# Altium footprint library SMD_Bauteile.PcbLib: 355 footprints (part 8 of 23)
Each footprint in its own frame and in the unit in brackets; x right, y up, seen from the top. Pads: shape width x height; smd on the part's side, far side on the other; paste and mask are expansions set on the pad; w line width, h text height; cw(c..) or ccw(c..) is an arc to the next point about the centre after c.
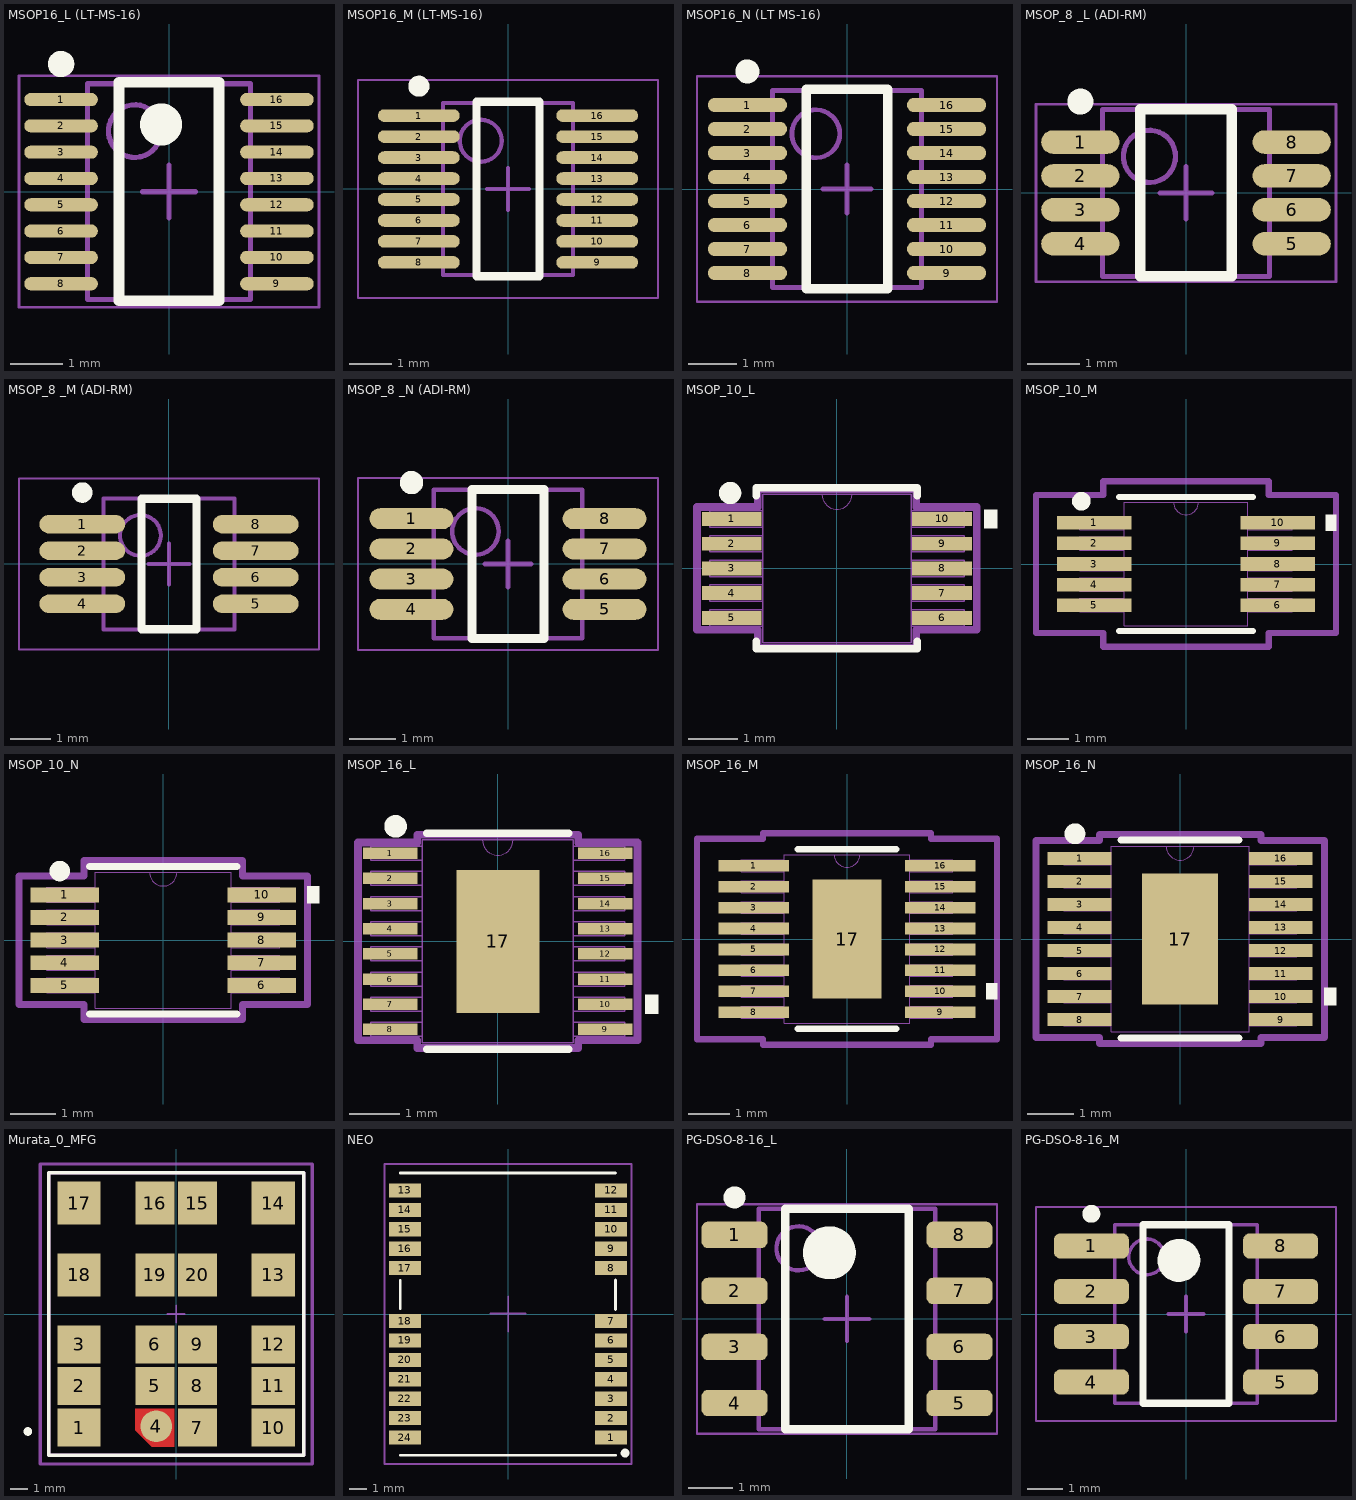
[diagram p7: the footprints below, top view; thin cyan lines are the x and y axes]

## MSOP16_L (LT-MS-16) [mm] "SOP, 16-Leads, Body 4.04x3.00mm, Pitch 0.50mm, IPC High Density"
height 1.1
pads (16):
  oval 1.4x0.25 smd: 1(-2.05,1.75) 2(-2.05,1.25) 3(-2.05,0.75) 4(-2.05,0.25) 5(-2.05,-0.25) 6(-2.05,-0.75) 7(-2.05,-1.25) 8(-2.05,-1.75) 9(2.05,-1.75) 10(2.05,-1.25) 11(2.05,-0.75) 12(2.05,-0.25) 13(2.05,0.25) 14(2.05,0.75) 15(2.05,1.25) 16(2.05,1.75)
Top Overlay:
  circle w0.25: c-2.05,2.425 r0.125
  circle w0.4: c-0.15,1.275 r0.2
  lines w0.2: -0.95,-2.075 -0.95,2.075 0.95,2.075 0.95,-2.075 -0.95,-2.075
Mech Misc 1:
  circle w0.1: c-0.65,1.15 r0.5
  lines w0.1: -1.55,-2.05 -1.55,2.05 1.55,2.05 1.55,-2.05 -1.55,-2.05
Mech 15:
  lines w0.05: -2.85,-2.2 -2.85,2.2 2.85,2.2 2.85,-2.2 -2.85,-2.2
  lines w0.1: -0.5,0 0.5,0 ; 0,-0.5 0,0.5
3D body: height 1.1, standoff 0.05, extent -1.55,-2.05 1.55,2.05

## MSOP16_M (LT-MS-16) [mm] "SOP, 16-Leads, Body 4.04x3.00mm, Pitch 0.50mm, IPC Low Density"
height 1.1
pads (16):
  oval 1.95x0.3 smd: 1(-2.125,1.75) 2(-2.125,1.25) 3(-2.125,0.75) 4(-2.125,0.25) 5(-2.125,-0.25) 6(-2.125,-0.75) 7(-2.125,-1.25) 8(-2.125,-1.75) 9(2.125,-1.75) 10(2.125,-1.25) 11(2.125,-0.75) 12(2.125,-0.25) 13(2.125,0.25) 14(2.125,0.75) 15(2.125,1.25) 16(2.125,1.75)
Top Overlay:
  circle w0.25: c-2.125,2.45 r0.125
  lines w0.2: -0.75,-2.075 -0.75,2.075 0.75,2.075 0.75,-2.075 -0.75,-2.075
Mech Misc 1:
  circle w0.1: c-0.65,1.15 r0.5
  lines w0.1: -1.55,-2.05 -1.55,2.05 1.55,2.05 1.55,-2.05 -1.55,-2.05
Mech 15:
  lines w0.05: -3.575,-2.6 -3.575,2.6 3.575,2.6 3.575,-2.6 -3.575,-2.6
  lines w0.1: -0.5,0 0.5,0 ; 0,-0.5 0,0.5
3D body: height 1.1, standoff 0.05, extent -1.55,-2.05 1.55,2.05

## MSOP16_N (LT MS-16) [mm] "SOP, 16-Leads, Body 4.04x3.00mm, Pitch 0.50mm, IPC Medium Density"
height 1.1
pads (16):
  oval 1.65x0.3 smd: 1(-2.075,1.75) 2(-2.075,1.25) 3(-2.075,0.75) 4(-2.075,0.25) 5(-2.075,-0.25) 6(-2.075,-0.75) 7(-2.075,-1.25) 8(-2.075,-1.75) 9(2.075,-1.75) 10(2.075,-1.25) 11(2.075,-0.75) 12(2.075,-0.25) 13(2.075,0.25) 14(2.075,0.75) 15(2.075,1.25) 16(2.075,1.75)
Top Overlay:
  circle w0.25: c-2.075,2.45 r0.125
  lines w0.2: -0.85,-2.075 -0.85,2.075 0.85,2.075 0.85,-2.075 -0.85,-2.075
Mech Misc 1:
  circle w0.1: c-0.65,1.15 r0.5
  lines w0.1: -1.55,-2.05 -1.55,2.05 1.55,2.05 1.55,-2.05 -1.55,-2.05
Mech 15:
  lines w0.05: -3.125,-2.35 -3.125,2.35 3.125,2.35 3.125,-2.35 -3.125,-2.35
  lines w0.1: -0.5,0 0.5,0 ; 0,-0.5 0,0.5
3D body: height 1.1, standoff 0.05, extent -1.55,-2.05 1.55,2.05

## MSOP_8 _L (ADI-RM) [mm] "SOP, 8-Leads, Body 3x3mm, Pitch 0.65mm, IPC High Density"
height 1.1
pads (8):
  oval 1.5x0.45 smd: 1(-2.025,0.975) 2(-2.025,0.325) 3(-2.025,-0.325) 4(-2.025,-0.975) 5(2.025,-0.975) 6(2.025,-0.325) 7(2.025,0.325) 8(2.025,0.975)
Top Overlay:
  circle w0.25: c-2.025,1.75 r0.125
  lines w0.2: -0.875,-1.6 -0.875,1.6 0.875,1.6 0.875,-1.6 -0.875,-1.6
Mech Misc 1:
  circle w0.1: c-0.7,0.7 r0.5
  lines w0.1: -1.6,-1.6 -1.6,1.6 1.6,1.6 1.6,-1.6 -1.6,-1.6
Mech 15:
  lines w0.05: -2.875,-1.7 -2.875,1.7 2.875,1.7 2.875,-1.7 -2.875,-1.7
  lines w0.1: -0.5,0 0.5,0 ; 0,-0.5 0,0.5
3D body: height 1.1, standoff 0, extent -1.6,-1.6 1.6,1.6

## MSOP_8 _M (ADI-RM) [mm] "SOP, 8-Leads, Body 3x3mm, Pitch 0.65mm, IPC Low Density"
height 1.1
pads (8):
  oval 2.1x0.45 smd: 1(-2.125,0.975) 2(-2.125,0.325) 3(-2.125,-0.325) 4(-2.125,-0.975) 5(2.125,-0.975) 6(2.125,-0.325) 7(2.125,0.325) 8(2.125,0.975)
Top Overlay:
  circle w0.25: c-2.125,1.75 r0.125
  lines w0.2: -0.675,-1.6 -0.675,1.6 0.675,1.6 0.675,-1.6 -0.675,-1.6
Mech Misc 1:
  circle w0.1: c-0.7,0.7 r0.5
  lines w0.1: -1.6,-1.6 -1.6,1.6 1.6,1.6 1.6,-1.6 -1.6,-1.6
Mech 15:
  lines w0.05: -3.675,-2.1 -3.675,2.1 3.675,2.1 3.675,-2.1 -3.675,-2.1
  lines w0.1: -0.5,0 0.5,0 ; 0,-0.5 0,0.5
3D body: height 1.1, standoff 0, extent -1.6,-1.6 1.6,1.6

## MSOP_8 _N (ADI-RM) [mm] "SOP, 8-Leads, Body 3x3mm, Pitch 0.65mm, IPC Medium Density"
height 1.1
pads (8):
  oval 1.8x0.45 smd: 1(-2.075,0.975) 2(-2.075,0.325) 3(-2.075,-0.325) 4(-2.075,-0.975) 5(2.075,-0.975) 6(2.075,-0.325) 7(2.075,0.325) 8(2.075,0.975)
Top Overlay:
  circle w0.25: c-2.075,1.75 r0.125
  lines w0.2: -0.775,-1.6 -0.775,1.6 0.775,1.6 0.775,-1.6 -0.775,-1.6
Mech Misc 1:
  circle w0.1: c-0.7,0.7 r0.5
  lines w0.1: -1.6,-1.6 -1.6,1.6 1.6,1.6 1.6,-1.6 -1.6,-1.6
Mech 15:
  lines w0.05: -3.225,-1.85 -3.225,1.85 3.225,1.85 3.225,-1.85 -3.225,-1.85
  lines w0.1: -0.5,0 0.5,0 ; 0,-0.5 0,0.5
3D body: height 1.1, standoff 0, extent -1.6,-1.6 1.6,1.6

## MSOP_10_L [mm] "10-Lead Plastic MSOP"
pads (10):
  rect 1.206x0.279 smd paste+0 mask+0: 1(-2.124,1) 2(-2.124,0.5) 3(-2.124,0) 4(-2.124,-0.5) 5(-2.124,-1) 6(2.124,-1) 7(2.124,-0.5) 8(2.124,0) 9(2.124,0.5) 10(2.124,1)
Top Overlay:
  circle w0.25: c-2.159,1.524 r0.1
  region: 2.981,1.191 3.235,1.191 3.235,0.81 2.981,0.81
  lines w0.152: -1.627,-1.472 -1.627,-1.627 1.627,-1.627 1.627,-1.472 ; -1.627,1.472 -1.627,1.627 1.627,1.627 1.627,1.472
Mech Misc 1:
  lines w0: -0.305,1.5 ccw(c0,1.5) 0.305,1.5
  lines w0.025: -2.575,-1.165 -1.5,-1.165 -1.5,-0.835 -2.575,-0.835 -2.575,-1.165 ; -2.575,-0.665 -1.5,-0.665 -1.5,-0.335 -2.575,-0.335 -2.575,-0.665 ; -2.575,-0.165 -1.5,-0.165 -1.5,0.165 -2.575,0.165 -2.575,-0.165 ; -2.575,0.335 -1.5,0.335 -1.5,0.665 -2.575,0.665 -2.575,0.335 ; -2.575,0.835 -1.5,0.835 -1.5,1.165 -2.575,1.165 -2.575,0.835 ; -1.5,-1.5 -1.5,1.5 1.5,1.5 1.5,-1.5 -1.5,-1.5 ; 1.5,-1.165 2.575,-1.165 2.575,-0.835 1.5,-0.835 1.5,-1.165 ; 1.5,-0.665 2.575,-0.665 2.575,-0.335 1.5,-0.335 1.5,-0.665 ; 1.5,-0.165 2.575,-0.165 2.575,0.165 1.5,0.165 1.5,-0.165 ; 1.5,0.335 2.575,0.335 2.575,0.665 1.5,0.665 1.5,0.335 ; 1.5,0.835 2.575,0.835 2.575,1.165 1.5,1.165 1.5,0.835
Mech 15:
  lines w0.152: -2.829,-1.241 -1.602,-1.241 -1.602,-1.602 1.602,-1.602 1.602,-1.241 2.829,-1.241 2.829,1.241 1.602,1.241 1.602,1.602 -1.602,1.602 -1.602,1.241 -2.829,1.241 -2.829,-1.241
3D body: height 0.25, standoff 0, extent 0,0 0.254,0.254
3D body "RM_10_ADI-L.step": height 1.1, standoff 0, extent -2.575,-1.5 2.575,1.5

## MSOP_10_M [mm] "10-Lead Plastic MSOP"
pads (10):
  rect 1.816x0.33 smd paste+0 mask+0: 1(-2.226,1) 2(-2.226,0.5) 3(-2.226,0) 4(-2.226,-0.5) 5(-2.226,-1) 6(2.226,-1) 7(2.226,-0.5) 8(2.226,0) 9(2.226,0.5) 10(2.226,1)
Top Overlay:
  circle w0.25: c-2.54,1.524 r0.1
  region: 3.388,1.191 3.642,1.191 3.642,0.81 3.388,0.81
  lines w0.152: -1.627,-1.627 1.627,-1.627 ; -1.627,1.627 1.627,1.627
Mech Misc 1:
  lines w0: -0.305,1.5 ccw(c0,1.5) 0.305,1.5
  lines w0.025: -2.575,-1.165 -2.575,-0.835 -1.5,-0.835 -1.5,-1.165 -2.575,-1.165 ; -2.575,-0.665 -2.575,-0.335 -1.5,-0.335 -1.5,-0.665 -2.575,-0.665 ; -2.575,-0.165 -2.575,0.165 -1.5,0.165 -1.5,-0.165 -2.575,-0.165 ; -2.575,0.335 -2.575,0.665 -1.5,0.665 -1.5,0.335 -2.575,0.335 ; -2.575,0.835 -2.575,1.165 -1.5,1.165 -1.5,0.835 -2.575,0.835 ; -1.5,-1.5 1.5,-1.5 1.5,1.5 -1.5,1.5 -1.5,-1.5 ; 1.5,-1.165 1.5,-0.835 2.575,-0.835 2.575,-1.165 1.5,-1.165 ; 1.5,-0.665 1.5,-0.335 2.575,-0.335 2.575,-0.665 1.5,-0.665 ; 1.5,-0.165 1.5,0.165 2.575,0.165 2.575,-0.165 1.5,-0.165 ; 1.5,0.335 1.5,0.665 2.575,0.665 2.575,0.335 1.5,0.335 ; 1.5,0.835 1.5,1.165 2.575,1.165 2.575,0.835 1.5,0.835
Mech 15:
  lines w0.152: -3.642,-1.673 -3.642,1.673 -2.008,1.673 -2.008,2.008 2.008,2.008 2.008,1.673 3.642,1.673 3.642,-1.673 2.008,-1.673 2.008,-2.008 -2.008,-2.008 -2.008,-1.673 -3.642,-1.673
3D body: height 0.25, standoff 0, extent 0,0 0.254,0.254
3D body "RM_10_ADI-M.step": height 1.1, standoff 0, extent -2.575,-1.5 2.575,1.5

## MSOP_10_N [mm] "10-Lead Plastic MSOP"
pads (10):
  rect 1.511x0.33 smd paste+0 mask+0: 1(-2.175,1) 2(-2.175,0.5) 3(-2.175,0) 4(-2.175,-0.5) 5(-2.175,-1) 6(2.175,-1) 7(2.175,-0.5) 8(2.175,0) 9(2.175,0.5) 10(2.175,1)
Top Overlay:
  circle w0.25: c-2.286,1.524 r0.1
  region: 3.185,1.191 3.439,1.191 3.439,0.81 3.185,0.81
  lines w0.152: -1.627,-1.627 1.627,-1.627 ; -1.627,1.627 1.627,1.627
Mech Misc 1:
  lines w0: -0.305,1.5 ccw(c0,1.5) 0.305,1.5
  lines w0.025: -2.575,-1.165 -1.5,-1.165 -1.5,-0.835 -2.575,-0.835 -2.575,-1.165 ; -2.575,-0.665 -1.5,-0.665 -1.5,-0.335 -2.575,-0.335 -2.575,-0.665 ; -2.575,-0.165 -1.5,-0.165 -1.5,0.165 -2.575,0.165 -2.575,-0.165 ; -2.575,0.335 -1.5,0.335 -1.5,0.665 -2.575,0.665 -2.575,0.335 ; -2.575,0.835 -1.5,0.835 -1.5,1.165 -2.575,1.165 -2.575,0.835 ; -1.5,-1.5 -1.5,1.5 1.5,1.5 1.5,-1.5 -1.5,-1.5 ; 1.5,-1.165 2.575,-1.165 2.575,-0.835 1.5,-0.835 1.5,-1.165 ; 1.5,-0.665 2.575,-0.665 2.575,-0.335 1.5,-0.335 1.5,-0.665 ; 1.5,-0.165 2.575,-0.165 2.575,0.165 1.5,0.165 1.5,-0.165 ; 1.5,0.335 2.575,0.335 2.575,0.665 1.5,0.665 1.5,0.335 ; 1.5,0.835 2.575,0.835 2.575,1.165 1.5,1.165 1.5,0.835
Mech 15:
  lines w0.152: -3.185,-1.419 -1.754,-1.419 -1.754,-1.754 1.754,-1.754 1.754,-1.419 3.185,-1.419 3.185,1.419 1.754,1.419 1.754,1.754 -1.754,1.754 -1.754,1.419 -3.185,1.419 -3.185,-1.419
3D body: height 0.25, standoff 0, extent 0,0 0.254,0.254
3D body "RM_10_ADI.step": height 1.1, standoff 0, extent -2.575,-1.5 2.575,1.5

## MSOP_16_L [mm] "16-Lead Plastic MSOP"
pads (17):
  rect 1.086x0.229 smd paste+0 mask+0: 1(-2.134,1.75) 2(-2.134,1.25) 3(-2.134,0.75) 4(-2.134,0.25) 5(-2.134,-0.25) 6(-2.134,-0.75) 7(-2.134,-1.25) 8(-2.134,-1.75) 9(2.134,-1.75) 10(2.134,-1.25) 11(2.134,-0.75) 12(2.134,-0.25) 13(2.134,0.25) 14(2.134,0.75) 15(2.134,1.25) 16(2.134,1.75)
  rect 1.651x2.845 smd paste-1.41 mask+0: 17(0,0)
Top Overlay:
  circle w0.25: c-2.032,2.286 r0.1
  region: 2.931,-1.06 3.185,-1.06 3.185,-1.441 2.931,-1.441
  lines w0.152: -1.414,-2.146 1.414,-2.146 ; -1.414,2.146 1.414,2.146
Top Paste:
  region: 0.726,1.322 -0.726,1.322 -0.726,0.1 0.726,0.1
  region: 0.726,-0.1 -0.726,-0.1 -0.726,-1.322 0.726,-1.322
Mech Misc 1:
  lines w0: -0.305,2.019 ccw(c0,2.019) 0.305,2.019
  lines w0.025: -2.527,-1.89 -2.527,-1.61 -1.499,-1.61 -1.499,-1.89 -2.527,-1.89 ; -2.527,-1.39 -2.527,-1.11 -1.499,-1.11 -1.499,-1.39 -2.527,-1.39 ; -2.527,-0.89 -2.527,-0.61 -1.499,-0.61 -1.499,-0.89 -2.527,-0.89 ; -2.527,-0.39 -2.527,-0.11 -1.499,-0.11 -1.499,-0.39 -2.527,-0.39 ; -2.527,0.11 -2.527,0.39 -1.499,0.39 -1.499,0.11 -2.527,0.11 ; -2.527,0.61 -2.527,0.89 -1.499,0.89 -1.499,0.61 -2.527,0.61 ; -2.527,1.11 -2.527,1.39 -1.499,1.39 -1.499,1.11 -2.527,1.11 ; -2.527,1.61 -2.527,1.89 -1.499,1.89 -1.499,1.61 -2.527,1.61 ; -1.499,-2.019 1.499,-2.019 1.499,2.019 -1.499,2.019 -1.499,-2.019 ; 1.499,-1.89 1.499,-1.61 2.527,-1.61 2.527,-1.89 1.499,-1.89 ; 1.499,-1.39 1.499,-1.11 2.527,-1.11 2.527,-1.39 1.499,-1.39 ; 1.499,-0.89 1.499,-0.61 2.527,-0.61 2.527,-0.89 1.499,-0.89 ; 1.499,-0.39 1.499,-0.11 2.527,-0.11 2.527,-0.39 1.499,-0.39 ; 1.499,0.11 1.499,0.39 2.527,0.39 2.527,0.11 1.499,0.11 ; 1.499,0.61 1.499,0.89 2.527,0.89 2.527,0.61 1.499,0.61 ; 1.499,1.11 1.499,1.39 2.527,1.39 2.527,1.11 1.499,1.11 ; 1.499,1.61 1.499,1.89 2.527,1.89 2.527,1.61 1.499,1.61
Mech 15:
  lines w0.152: -2.779,-1.966 -2.779,1.966 -1.6,1.966 -1.6,2.121 1.6,2.121 1.6,1.966 2.779,1.966 2.779,-1.966 1.6,-1.966 1.6,-2.121 -1.6,-2.121 -1.6,-1.966 -2.779,-1.966
3D body: height 0.25, standoff 0, extent 0,0 0.254,0.254
3D body "MSE_16_ADI-L.step": height 1.7, standoff 0, extent -2.527,-2.019 2.527,2.019

## MSOP_16_M [mil] "16-Lead Plastic MSOP"
pads (17):
  rect 66.37x11 smd paste+0 mask+0: 1(-87.97,68.9) 2(-87.97,49.21) 3(-87.97,29.53) 4(-87.97,9.84) 5(-87.97,-9.84) 6(-87.97,-29.53) 7(-87.97,-49.21) 8(-87.97,-68.9) 9(87.97,-68.9) 10(87.97,-49.21) 11(87.97,-29.53) 12(87.97,-9.84) 13(87.97,9.84) 14(87.97,29.53) 15(87.97,49.21) 16(87.97,68.9)
  rect 65x112 smd paste-55.5 mask+0: 17(0,0)
Top Overlay:
  region: 131.15,-41.71 141.15,-41.71 141.15,-56.71 131.15,-56.71
  lines w6: -46.44,-84.5 46.44,-84.5 ; -46.44,84.5 46.44,84.5
Top Paste:
  region: 28.56,52.06 -28.56,52.06 -28.56,3.94 28.56,3.94
  region: 28.56,-3.94 -28.56,-3.94 -28.56,-52.06 28.56,-52.06
Mech Misc 1:
  lines w0: -12,79.5 ccw(c0,79.5) 12,79.5
  lines w1: -99.5,-74.4 -99.5,-63.4 -59,-63.4 -59,-74.4 -99.5,-74.4 ; -99.5,-54.71 -99.5,-43.71 -59,-43.71 -59,-54.71 -99.5,-54.71 ; -99.5,-35.03 -99.5,-24.03 -59,-24.03 -59,-35.03 -99.5,-35.03 ; -99.5,-15.34 -99.5,-4.34 -59,-4.34 -59,-15.34 -99.5,-15.34 ; -99.5,4.34 -99.5,15.34 -59,15.34 -59,4.34 -99.5,4.34 ; -99.5,24.03 -99.5,35.03 -59,35.03 -59,24.03 -99.5,24.03 ; -99.5,43.71 -99.5,54.71 -59,54.71 -59,43.71 -99.5,43.71 ; -99.5,63.4 -99.5,74.4 -59,74.4 -59,63.4 -99.5,63.4 ; -59,-79.5 59,-79.5 59,79.5 -59,79.5 -59,-79.5 ; 59,-74.4 59,-63.4 99.5,-63.4 99.5,-74.4 59,-74.4 ; 59,-54.71 59,-43.71 99.5,-43.71 99.5,-54.71 59,-54.71 ; 59,-35.03 59,-24.03 99.5,-24.03 99.5,-35.03 59,-35.03 ; 59,-15.34 59,-4.34 99.5,-4.34 99.5,-15.34 59,-15.34 ; 59,4.34 59,15.34 99.5,15.34 99.5,4.34 59,4.34 ; 59,24.03 59,35.03 99.5,35.03 99.5,24.03 59,24.03 ; 59,43.71 59,54.71 99.5,54.71 99.5,43.71 59,43.71 ; 59,63.4 59,74.4 99.5,74.4 99.5,63.4 59,63.4
Mech 15:
  lines w6: -141.15,-94.4 -141.15,94.4 -79,94.4 -79,99.5 79,99.5 79,94.4 141.15,94.4 141.15,-94.4 79,-94.4 79,-99.5 -79,-99.5 -79,-94.4 -141.15,-94.4
3D body: height 10, standoff 0, extent 0,0 10,10
3D body "MSE_16_ADI-M.step": height 67.09, standoff 0, extent -99.48,-79.48 99.49,79.49

## MSOP_16_N [mil] "16-Lead Plastic MSOP"
pads (17):
  rect 54.56x11 smd paste+0 mask+0: 1(-86,68.9) 2(-86,49.21) 3(-86,29.53) 4(-86,9.84) 5(-86,-9.84) 6(-86,-29.53) 7(-86,-49.21) 8(-86,-68.9) 9(86,-68.9) 10(86,-49.21) 11(86,-29.53) 12(86,-9.84) 13(86,9.84) 14(86,29.53) 15(86,49.21) 16(86,68.9)
  rect 65x112 smd paste-55.5 mask+0: 17(0,0)
Top Overlay:
  circle w9.84: c-90,90 r3.94
  region: 123.28,-41.71 133.28,-41.71 133.28,-56.71 123.28,-56.71
  lines w6: -50.38,-84.5 50.38,-84.5 ; -50.38,84.5 50.38,84.5
Top Paste:
  region: 28.56,-3.94 -28.56,-3.94 -28.56,-52.06 28.56,-52.06
  region: 28.56,52.06 -28.56,52.06 -28.56,3.94 28.56,3.94
Mech Misc 1:
  lines w0: -12,79.5 ccw(c0,79.5) 12,79.5
  lines w1: -99.5,-74.4 -59,-74.4 -59,-63.4 -99.5,-63.4 -99.5,-74.4 ; -99.5,-54.71 -59,-54.71 -59,-43.71 -99.5,-43.71 -99.5,-54.71 ; -99.5,-35.03 -59,-35.03 -59,-24.03 -99.5,-24.03 -99.5,-35.03 ; -99.5,-15.34 -59,-15.34 -59,-4.34 -99.5,-4.34 -99.5,-15.34 ; -99.5,4.34 -59,4.34 -59,15.34 -99.5,15.34 -99.5,4.34 ; -99.5,24.03 -59,24.03 -59,35.03 -99.5,35.03 -99.5,24.03 ; -99.5,43.71 -59,43.71 -59,54.71 -99.5,54.71 -99.5,43.71 ; -99.5,63.4 -59,63.4 -59,74.4 -99.5,74.4 -99.5,63.4 ; -59,-79.5 -59,79.5 59,79.5 59,-79.5 -59,-79.5 ; 59,-74.4 99.5,-74.4 99.5,-63.4 59,-63.4 59,-74.4 ; 59,-54.71 99.5,-54.71 99.5,-43.71 59,-43.71 59,-54.71 ; 59,-35.03 99.5,-35.03 99.5,-24.03 59,-24.03 59,-35.03 ; 59,-15.34 99.5,-15.34 99.5,-4.34 59,-4.34 59,-15.34 ; 59,4.34 99.5,4.34 99.5,15.34 59,15.34 59,4.34 ; 59,24.03 99.5,24.03 99.5,35.03 59,35.03 59,24.03 ; 59,43.71 99.5,43.71 99.5,54.71 59,54.71 59,43.71 ; 59,63.4 99.5,63.4 99.5,74.4 59,74.4 59,63.4
Mech 15:
  lines w6: -123.28,-84.4 -69,-84.4 -69,-89.5 69,-89.5 69,-84.4 123.28,-84.4 123.28,84.4 69,84.4 69,89.5 -69,89.5 -69,84.4 -123.28,84.4 -123.28,-84.4
3D body: height 10, standoff 0, extent 0,0 10,10
3D body "MSE_16_ADI.step": height 67.09, standoff 0, extent -99.48,-79.48 99.49,79.49

## Murata_0_MFG [mm]
pads (20):
  rect 2.5x2.2 smd paste+0 mask+0: 1(-5.6,-6.55) 2(-5.6,-4.15) 3(-5.6,-1.75) 10(5.6,-6.55) 11(5.6,-4.15) 12(5.6,-1.75)
  round 1.826 smd paste+0 mask+0: 4(-1.144,-6.471)
  rect 2.25x2.2 smd paste+0 mask+0: 5(-1.225,-4.15) 6(-1.225,-1.75) 7(1.225,-6.55) 8(1.225,-4.15) 9(1.225,-1.75)
  rect 2.5x2.5 smd paste+0 mask+0: 13(5.6,2.25) 14(5.6,6.4) 17(-5.6,6.4) 18(-5.6,2.25)
  rect 2.25x2.5 smd paste+0 mask+0: 15(1.225,6.4) 16(-1.225,6.4) 19(-1.225,2.25) 20(1.225,2.25)
Top Layer:
  region: -2.35,-5.45 -0.1,-5.45 -0.1,-7.65 -1.4,-7.65 -2.35,-6.7
Top Overlay:
  circle w0.25: c-8.55,-6.775 r0.125
  lines w0.2: -7.35,-8.15 7.35,-8.15 7.35,8.15 -7.35,8.15 -7.35,-8.15
Board Shape:
  lines w0.2: -7.85,-8.65 7.85,-8.65 7.85,8.65 -7.85,8.65 -7.85,-8.65
Assembly Notes:
  lines w0.2: -7.35,-8.15 7.35,-8.15 7.35,8.15 -7.35,8.15 -7.35,-8.15
Mech 15:
  lines w0.1: -0.5,0 0.5,0 ; 0,-0.5 0,0.5
  lines w0.2: -7.85,-8.65 7.85,-8.65 7.85,8.65 -7.85,8.65 -7.85,-8.65
3D body "IC_Murata_MYSGK02506BRSR_eec.STEP": height 0.25, standoff 0, extent -7.85,-8.65 7.85,8.65

## NEO [mm] "u-blox NEO GNSS module"
height 3.35
pads (24):
  rect 1.8x0.8 smd paste-0.1: 1(5.842,-7) 2(5.842,-5.9) 3(5.842,-4.8) 4(5.842,-3.7) 5(5.842,-2.6) 6(5.842,-1.5) 7(5.842,-0.4) 8(5.842,2.6) 9(5.842,3.7) 10(5.842,4.8) 11(5.842,5.9) 12(5.842,7) 13(-5.842,7) 14(-5.842,5.9) 15(-5.842,4.8) 16(-5.842,3.7) 17(-5.842,2.6) 18(-5.842,-0.4) 19(-5.842,-1.5) 20(-5.842,-2.6) 21(-5.842,-3.7) 22(-5.842,-4.8) 23(-5.842,-5.9) 24(-5.842,-7)
Top Overlay:
  circle w0.38: c6.636,-7.879 r0.058
  lines w0.16: -6.109,-8 6.096,-8 ; -6.109,7.996 6.09,7.996 ; -6.102,0.299 -6.102,1.893 ; 6.096,0.255 6.096,1.919
Top Paste:
  rectangle: -6.833,-4.1 -5.633,-3.3
  rectangle: -6.833,-7.4 -5.633,-6.6
  rectangle: -6.833,-6.3 -5.633,-5.5
  rectangle: -6.833,-5.2 -5.633,-4.4
  rectangle: -6.833,-3 -5.633,-2.2
  rectangle: -6.833,-1.9 -5.633,-1.1
  rectangle: -6.833,-0.8 -5.633,0
  rectangle: -6.833,2.2 -5.633,3
  rectangle: -6.833,3.3 -5.633,4.1
  rectangle: -6.833,4.4 -5.633,5.2
  rectangle: -6.833,5.5 -5.633,6.3
  rectangle: -6.833,6.6 -5.633,7.4
  rectangle: 5.642,6.6 6.842,7.4
  rectangle: 5.642,5.5 6.842,6.3
  rectangle: 5.642,4.4 6.842,5.2
  rectangle: 5.642,3.3 6.842,4.1
  rectangle: 5.642,2.2 6.842,3
  rectangle: 5.642,-0.8 6.842,0
  rectangle: 5.642,-1.9 6.842,-1.1
  rectangle: 5.642,-3 6.842,-2.2
  rectangle: 5.642,-4.1 6.842,-3.3
  rectangle: 5.642,-5.2 6.842,-4.4
  rectangle: 5.642,-6.3 6.842,-5.5
  rectangle: 5.642,-7.4 6.842,-6.6
Mech 15:
  lines w0.1: -1,0.024 0.02,0.024 ; 0.02,-1 0.02,0.024 ; 0.02,1 0.02,0.024 ; 1,0.024 0.02,0.024 ; -7,-8.5 -7,8.5 7,8.5 7,-8.5 -7,-8.5
3D body "NEO (STEP-AP214)_B.STEP": height 2.28, standoff -0.05, extent -6.104,-8 6.096,8

## PG-DSO-8-16_L [mm] "SOP, 8-Leads, Body 4.9x3.9mm, Pitch 1.27mm, IPC High Density"
height 1.75
pads (8):
  rrect50% 1.5x0.6 smd: 1(-2.55,1.905) 2(-2.55,0.635) 3(-2.55,-0.635) 4(-2.55,-1.905) 5(2.55,-1.905) 6(2.55,-0.635) 7(2.55,0.635) 8(2.55,1.905)
Top Overlay:
  circle w0.25: c-2.55,2.755 r0.125
  circle w0.6: c-0.4,1.5 r0.3
  lines w0.2: -1.4,-2.5 -1.4,2.5 1.4,2.5 1.4,-2.5 -1.4,-2.5
Top Component Center:
  lines w0.1: -0.5,0 0.5,0 ; 0,-0.5 0,0.5
Top Component Outline:
  circle w0.1: c-1.1,1.6 r0.5
  lines w0.1: -2,-2.5 2,-2.5 2,2.5 -2,2.5 -2,-2.5
Top Courtyard (Mech26):
  lines w0.05: -3.4,-2.6 -3.4,2.6 3.4,2.6 3.4,-2.6 -3.4,-2.6
3D body: height 1.75, standoff 0.11, extent -2,-2.5 2,2.5

## PG-DSO-8-16_M [mm] "SOP, 8-Leads, Body 4.9x3.9mm, Pitch 1.27mm, IPC Low Density"
height 1.75
pads (8):
  rrect50% 2.1x0.7 smd: 1(-2.65,1.905) 2(-2.65,0.635) 3(-2.65,-0.635) 4(-2.65,-1.905) 5(2.65,-1.905) 6(2.65,-0.635) 7(2.65,0.635) 8(2.65,1.905)
Top Overlay:
  circle w0.6: c-0.2,1.5 r0.3
  circle w0.25: c-2.65,2.805 r0.125
  lines w0.2: -1.2,-2.5 1.2,-2.5 1.2,2.5 -1.2,2.5 -1.2,-2.5
Top Component Center:
  lines w0.1: -0.5,0 0.5,0 ; 0,-0.5 0,0.5
Top Component Outline:
  circle w0.1: c-1.1,1.6 r0.5
  lines w0.1: -2,-2.5 -2,2.5 2,2.5 2,-2.5 -2,-2.5
Top Courtyard (Mech26):
  lines w0.05: -4.2,-3 -4.2,3 4.2,3 4.2,-3 -4.2,-3
3D body: height 1.75, standoff 0.11, extent -2,-2.5 2,2.5